# Altium footprint library Nanjar's Library.PcbLib: 153 footprints (part 4 of 10)
Each footprint in its own frame and in the unit in brackets; x right, y up, seen from the top. Pads: shape width x height; smd on the part's side, far side on the other; paste and mask are expansions set on the pad; w line width, h text height; cw(c..) or ccw(c..) is an arc to the next point about the centre after c.
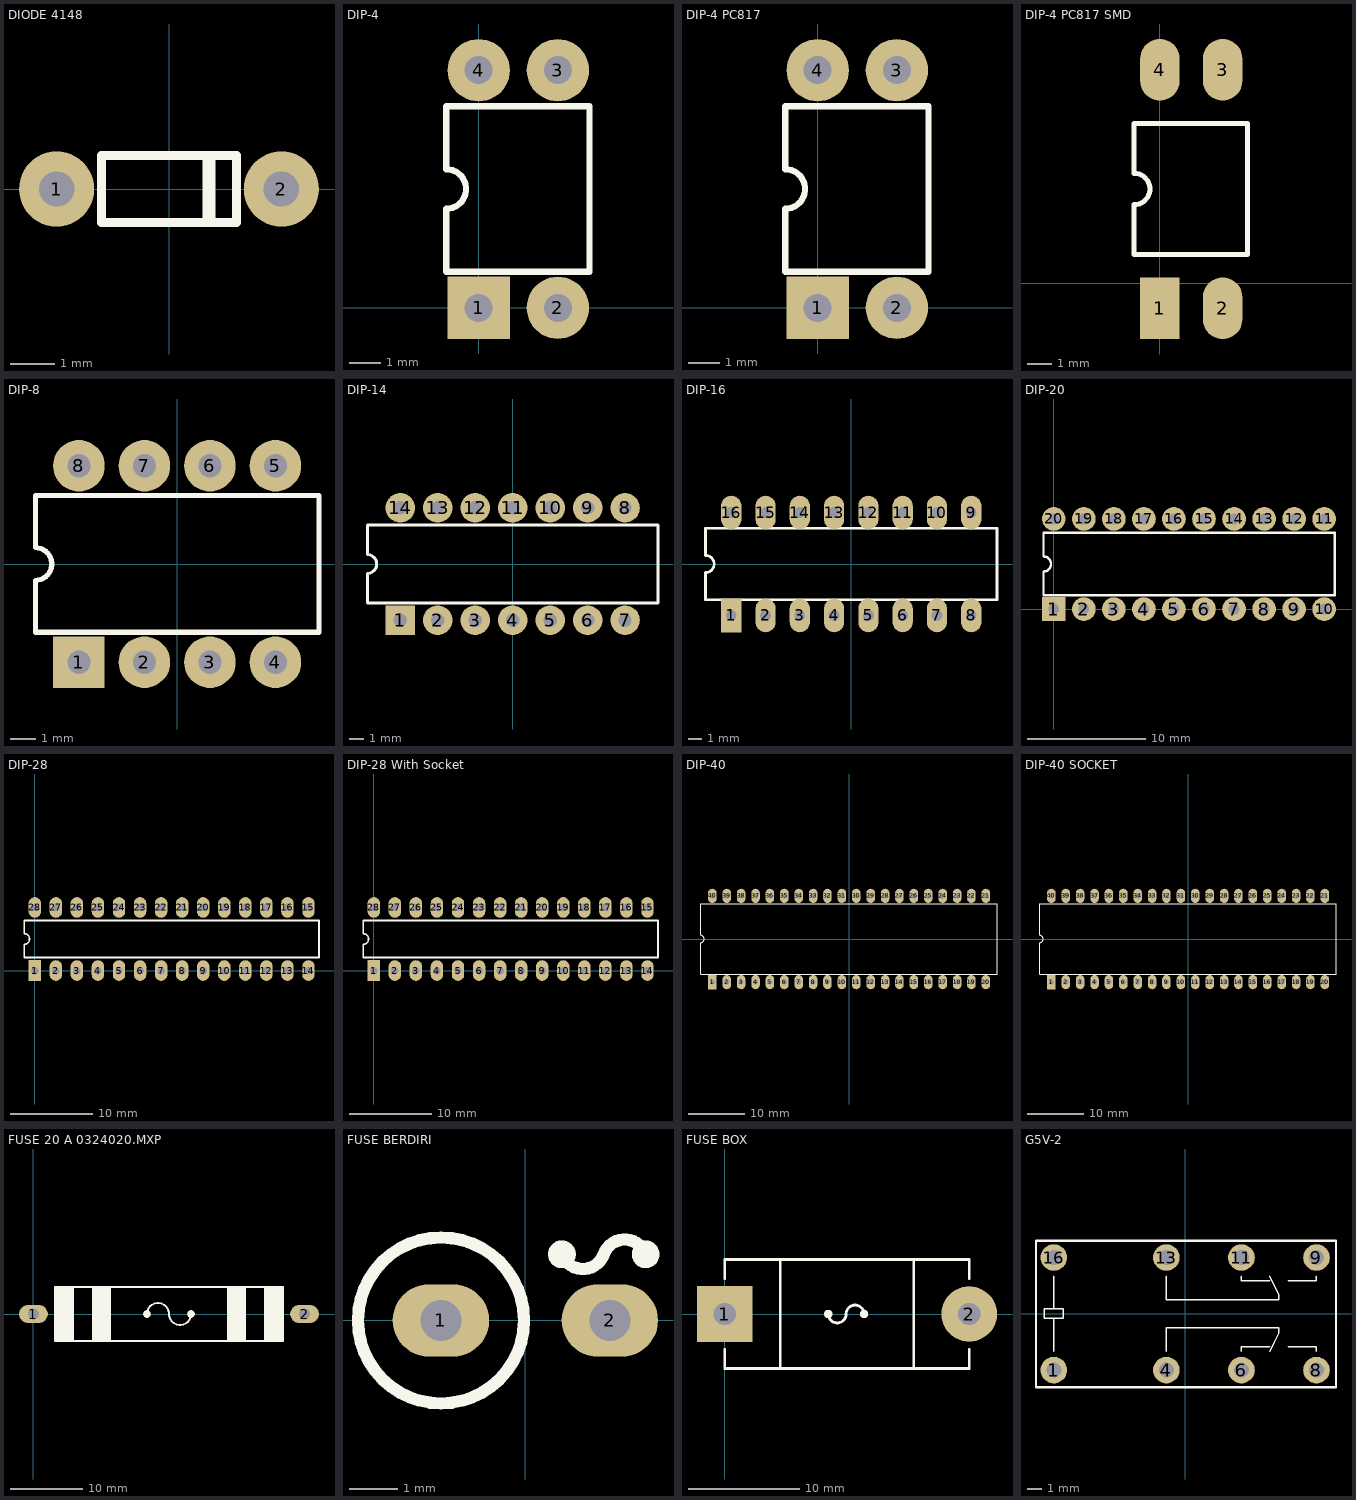
[diagram p3: the footprints below, top view; thin cyan lines are the x and y axes]

## DIODE 4148 [mm] "DIODE 4148"
height 1.9
pads (2):
  round 1.7 hole 0.8: 1(-2.54,0) 2(2.54,0)
Top Overlay:
  rectangle: 0.762,-0.762 1.054,0.762
  lines w0.2: -1.524,-0.762 -1.524,0.762 ; 1.524,-0.762 1.524,0.762
  lines w0.203: -1.524,-0.762 1.524,-0.762 ; -1.524,0.762 1.524,0.762
3D body "User Library-1N4148 x5mm.step": height 1.55, standoff -2.55, extent -2.75,-0.762 2.75,0.738

## DIP-4 [mm] "DIP; 14 Leads; Row Spacing 7.62 mm; Pitch 2.54 mm"
height 5.08
pads (4):
  rect 2x2 hole 0.9: 1(0,0)
  round 2 hole 0.9: 2(2.54,0) 3(2.54,7.62) 4(0,7.62)
Top Overlay:
  lines w0.2: -1.041,1.16 -1.041,3.175 ccw(c-1.041,3.81) -1.041,4.445 -1.041,6.46 3.556,6.46 3.556,1.16 -1.041,1.16
3D body "User Library-DIP4.STEP": height 3.75, standoff -2.55, extent -1.027,-0.074 3.567,7.796

## DIP-4 PC817 [mm] "DIP; 14 Leads; Row Spacing 7.62 mm; Pitch 2.54 mm"
height 5.08
pads (4):
  rect 2x2 hole 0.9: 1(0,0)
  round 2 hole 0.9: 2(2.54,0) 3(2.54,7.62) 4(0,7.62)
Top Overlay:
  lines w0.2: -1.041,1.16 -1.041,3.175 ccw(c-1.041,3.81) -1.041,4.445 -1.041,6.46 3.556,6.46 3.556,1.16 -1.041,1.16
3D body "User Library-DIP4-7_62-2_54.STEP": height 3.8, standoff -3.2, extent -1.027,-0.079 3.563,7.801

## DIP-4 PC817 SMD [mm] "DIP; 14 Leads; Row Spacing 7.62 mm; Pitch 2.54 mm"
height 5.08
pads (4):
  rect 1.6x2.5 smd: 1(0,-1.016)
  oval 1.6x2.5 smd: 2(2.54,-1.016) 3(2.54,8.636) 4(0,8.636)
Top Overlay:
  lines w0.2: -1.041,1.16 -1.041,3.175 ccw(c-1.041,3.81) -1.041,4.445 -1.041,6.46 3.556,6.46 3.556,1.16 -1.041,1.16
3D body "User Library-DIP4_opto_iso.STEP": height 3.9, standoff 0, extent -1.147,-1.154 3.684,8.876

## DIP-8 [mm] "DIP; 8 Leads; Row Spacing 7.62 mm; Pitch 2.54 mm"
height 5.08
pads (8):
  rect 2x2 hole 0.9: 1(-3.81,-3.81)
  round 2 hole 0.9: 2(-1.27,-3.81) 3(1.27,-3.81) 4(3.81,-3.81) 5(3.81,3.81) 6(1.27,3.81) 7(-1.27,3.81) 8(-3.81,3.81)
Top Overlay:
  lines w0.2: -5.5,-2.65 -5.5,-0.635 ccw(c-5.5,0) -5.5,0.635 -5.5,2.65 5.5,2.65 5.5,-2.65 -5.5,-2.65
3D body "SW3DPS-DIP8-DEFAULT.STEP": height 4.19, standoff -2.67, extent -5.725,-3.962 5.705,3.912

## DIP-14 [mm] "DIP; 14 Leads; Row Spacing 7.62 mm; Pitch 2.54 mm"
height 5.08
pads (14):
  rect 2x2 hole 0.9: 1(-7.62,-3.81)
  round 2 hole 0.9: 2(-5.08,-3.81) 3(-2.54,-3.81) 4(0,-3.81) 5(2.54,-3.81) 6(5.08,-3.81) 7(7.62,-3.81) 8(7.62,3.81) 9(5.08,3.81) 10(2.54,3.81) 11(0,3.81) 12(-2.54,3.81) 13(-5.08,3.81) 14(-7.62,3.81)
Top Overlay:
  lines w0.2: -9.85,-2.65 -9.85,-0.635 ccw(c-9.85,0) -9.85,0.635 -9.85,2.65 9.85,2.65 9.85,-2.65 -9.85,-2.65
3D body "SW3DPS-DIP-14-DEFAULT.STEP": height 3.51, standoff -3.47, extent -9.525,-3.95 9.525,4.05

## DIP-16 [mm] "DIP; 16 Leads; Row Spacing 7.62 mm; Pitch 2.54 mm"
height 5.08
pads (16):
  rect 1.5x2.5 hole 0.8: 1(-8.89,-3.81)
  oval 1.5x2.5 hole 0.8: 2(-6.35,-3.81) 3(-3.81,-3.81) 4(-1.27,-3.81) 5(1.27,-3.81) 6(3.81,-3.81) 7(6.35,-3.81) 8(8.89,-3.81) 9(8.89,3.81) 10(6.35,3.81) 11(3.81,3.81) 12(1.27,3.81) 13(-1.27,3.81) 14(-3.81,3.81) 15(-6.35,3.81) 16(-8.89,3.81)
Top Overlay:
  lines w0.2: -10.795,-2.65 -10.795,-0.635 ccw(c-10.795,0) -10.795,0.635 -10.795,2.65 10.8,2.65 10.8,-2.65 -10.795,-2.65
3D body "CircuitWorks-DIP16.step": height 2.57, standoff -4.19, extent -10.795,-3.81 10.795,4.064

## DIP-20 [mm] "DIP; 14 Leads; Row Spacing 7.62 mm; Pitch 2.54 mm"
height 5.08
pads (20):
  rect 2x2 hole 0.9: 1(0,0)
  round 2 hole 0.9: 2(2.54,0) 3(5.08,0) 4(7.62,0) 5(10.16,0) 6(12.7,0) 7(15.24,0) 8(17.78,0) 9(20.32,0) 10(22.86,0) 11(22.86,7.62) 12(20.32,7.62) 13(17.78,7.62) 14(15.24,7.62) 15(12.7,7.62) 16(10.16,7.62) 17(7.62,7.62) 18(5.08,7.62) 19(2.54,7.62) 20(0,7.62)
Top Overlay:
  lines w0.2: -0.87,1.16 -0.87,3.175 ccw(c-0.87,3.81) -0.87,4.445 -0.87,6.46 23.745,6.46 23.745,1.16 -0.87,1.16
3D body "User Library-DIP-20P-M01.STEP": height 4.36, standoff -3, extent -0.87,-0.125 23.73,7.745

## DIP-28 [mm] "DIP; 28 Leads; Row Spacing 7.62 mm; Pitch 2.54 mm"
height 4.58
pads (28):
  rect 1.5x2.5 hole 0.9: 1(0,0)
  oval 1.5x2.5 hole 0.9: 2(2.54,0) 3(5.08,0) 4(7.62,0) 5(10.16,0) 6(12.7,0) 7(15.24,0) 8(17.78,0) 9(20.32,0) 10(22.86,0) 11(25.4,0) 12(27.94,0) 13(30.48,0) 14(33.02,0) 15(33.02,7.62) 16(30.48,7.62) 17(27.94,7.62) 18(25.4,7.62) 19(22.86,7.62) 20(20.32,7.62) 21(17.78,7.62) 22(15.24,7.62) 23(12.7,7.62) 24(10.16,7.62) 25(7.62,7.62) 26(5.08,7.62) 27(2.54,7.62) 28(0,7.62)
Top Overlay:
  lines w0.2: -1.27,1.585 34.29,1.585 34.29,6.035 -1.27,6.035 -1.27,4.445 cw(c-1.27,3.81) -1.27,3.175 -1.27,1.585
3D body "User Library-DIP-28P-M04.STEP": height 4.8, standoff -3.4, extent -1.19,-0.125 34.21,7.745

## DIP-28 With Socket [mm] "DIP; 28 Leads; Row Spacing 7.62 mm; Pitch 2.54 mm"
height 4.58
pads (28):
  rect 1.5x2.5 hole 0.9: 1(0,0)
  oval 1.5x2.5 hole 0.9: 2(2.54,0) 3(5.08,0) 4(7.62,0) 5(10.16,0) 6(12.7,0) 7(15.24,0) 8(17.78,0) 9(20.32,0) 10(22.86,0) 11(25.4,0) 12(27.94,0) 13(30.48,0) 14(33.02,0) 15(33.02,7.62) 16(30.48,7.62) 17(27.94,7.62) 18(25.4,7.62) 19(22.86,7.62) 20(20.32,7.62) 21(17.78,7.62) 22(15.24,7.62) 23(12.7,7.62) 24(10.16,7.62) 25(7.62,7.62) 26(5.08,7.62) 27(2.54,7.62) 28(0,7.62)
Top Overlay:
  lines w0.2: -1.27,1.585 34.29,1.585 34.29,6.035 -1.27,6.035 -1.27,4.445 cw(c-1.27,3.81) -1.27,3.175 -1.27,1.585
3D body "User Library-28pin 0_3inch 2_54mm IC DIP Socket.STEP": height 5, standoff -3, extent -1.265,-1.265 34.295,8.895
3D body "User Library-DIP-28P-M04.STEP": height 8.8, standoff 0.6, extent -1.19,-0.125 34.21,7.745

## DIP-40 [mm] "DIP; 40 Leads; Row Spacing 15.24 mm; Pitch 2.54 mm"
height 5.72
pads (40):
  rect 1.5x2.5 hole 0.9: 1(-24.13,-7.62)
  oval 1.5x2.5 hole 0.9: 2(-21.59,-7.62) 3(-19.05,-7.62) 4(-16.51,-7.62) 5(-13.97,-7.62) 6(-11.43,-7.62) 7(-8.89,-7.62) 8(-6.35,-7.62) 9(-3.81,-7.62) 10(-1.27,-7.62) 11(1.27,-7.62) 12(3.81,-7.62) 13(6.35,-7.62) 14(8.89,-7.62) 15(11.43,-7.62) 16(13.97,-7.62) 17(16.51,-7.62) 18(19.05,-7.62) 19(21.59,-7.62) 20(24.13,-7.62) 21(24.13,7.62) 22(21.59,7.62) 23(19.05,7.62) 24(16.51,7.62) 25(13.97,7.62) 26(11.43,7.62) 27(8.89,7.62) 28(6.35,7.62) 29(3.81,7.62) 30(1.27,7.62) 31(-1.27,7.62) 32(-3.81,7.62) 33(-6.35,7.62) 34(-8.89,7.62) 35(-11.43,7.62) 36(-13.97,7.62) 37(-16.51,7.62) 38(-19.05,7.62) 39(-21.59,7.62) 40(-24.13,7.62)
Top Overlay:
  lines w0.2: -26.2,-6.2 26.1,-6.2 26.1,6.2 -26.2,6.2 -26.2,0.635 cw(c-26.2,0) -26.2,-0.635 -26.2,-6.2
3D body: height 1.31, standoff -2.5, extent -24.41,7.37 -23.85,7.87
3D body: height 2.8, standoff 0.81, extent -24.96,7.37 -23.29,7.87
3D body: height 3.08, standoff 2.58, extent -24.96,6.73 -23.29,7.62
3D body: height 3.07, standoff 2.58, extent -24.96,7.37 -23.29,7.868
3D body: height 3.07, standoff 2.58, extent -22.42,7.37 -20.75,7.868
3D body: height 3.08, standoff 2.58, extent -22.42,6.73 -20.75,7.62
3D body: height 2.8, standoff 0.81, extent -22.42,7.37 -20.75,7.87
3D body: height 1.31, standoff -2.5, extent -21.87,7.37 -21.31,7.87
3D body: height 3.07, standoff 2.58, extent -19.88,7.37 -18.21,7.868
3D body: height 3.08, standoff 2.58, extent -19.88,6.73 -18.21,7.62
3D body: height 2.8, standoff 0.81, extent -19.88,7.37 -18.21,7.87
3D body: height 1.31, standoff -2.5, extent -19.33,7.37 -18.77,7.87
3D body: height 3.07, standoff 2.58, extent -17.34,7.37 -15.67,7.868
3D body: height 3.08, standoff 2.58, extent -17.34,6.73 -15.67,7.62
3D body: height 2.8, standoff 0.81, extent -17.34,7.37 -15.67,7.87
3D body: height 1.31, standoff -2.5, extent -16.79,7.37 -16.23,7.87
3D body: height 1.31, standoff -2.5, extent -6.63,7.37 -6.07,7.87
3D body: height 2.8, standoff 0.81, extent -7.18,7.37 -5.51,7.87
3D body: height 3.08, standoff 2.58, extent -7.18,6.73 -5.51,7.62
3D body: height 3.07, standoff 2.58, extent -7.18,7.37 -5.51,7.868
3D body: height 1.31, standoff -2.5, extent -9.17,7.37 -8.61,7.87
3D body: height 2.8, standoff 0.81, extent -9.72,7.37 -8.05,7.87
3D body: height 3.08, standoff 2.58, extent -9.72,6.73 -8.05,7.62
3D body: height 3.07, standoff 2.58, extent -9.72,7.37 -8.05,7.868
3D body: height 1.31, standoff -2.5, extent -11.71,7.37 -11.15,7.87
3D body: height 2.8, standoff 0.81, extent -12.26,7.37 -10.59,7.87
3D body: height 3.08, standoff 2.58, extent -12.26,6.73 -10.59,7.62
3D body: height 3.07, standoff 2.58, extent -12.26,7.37 -10.59,7.868
3D body: height 3.07, standoff 2.58, extent -14.8,7.37 -13.13,7.868
3D body: height 3.08, standoff 2.58, extent -14.8,6.73 -13.13,7.62
3D body: height 2.8, standoff 0.81, extent -14.8,7.37 -13.13,7.87
3D body: height 1.31, standoff -2.5, extent -14.25,7.37 -13.69,7.87
3D body: height 1.31, standoff -2.5, extent 3.53,7.37 4.09,7.87
3D body: height 2.8, standoff 0.81, extent 2.98,7.37 4.65,7.87
3D body: height 3.08, standoff 2.58, extent 2.98,6.73 4.65,7.62
3D body: height 3.07, standoff 2.58, extent 2.98,7.37 4.65,7.868
3D body: height 1.31, standoff -2.5, extent 0.99,7.37 1.55,7.87
3D body: height 2.8, standoff 0.81, extent 0.44,7.37 2.11,7.87
3D body: height 3.08, standoff 2.58, extent 0.44,6.73 2.11,7.62
3D body: height 3.07, standoff 2.58, extent 0.44,7.37 2.11,7.868
3D body: height 1.31, standoff -2.5, extent -1.55,7.37 -0.99,7.87
3D body: height 2.8, standoff 0.81, extent -2.1,7.37 -0.43,7.87
3D body: height 3.08, standoff 2.58, extent -2.1,6.73 -0.43,7.62
3D body: height 3.07, standoff 2.58, extent -2.1,7.37 -0.43,7.868
3D body: height 3.07, standoff 2.58, extent -4.64,7.37 -2.97,7.868
3D body: height 3.08, standoff 2.58, extent -4.64,6.73 -2.97,7.62
3D body: height 2.8, standoff 0.81, extent -4.64,7.37 -2.97,7.87
3D body: height 1.31, standoff -2.5, extent -4.09,7.37 -3.53,7.87
3D body: height 1.31, standoff -2.5, extent 13.69,7.37 14.25,7.87
3D body: height 2.8, standoff 0.81, extent 13.14,7.37 14.81,7.87
3D body: height 3.08, standoff 2.58, extent 13.14,6.73 14.81,7.62
3D body: height 3.07, standoff 2.58, extent 13.14,7.37 14.81,7.868
3D body: height 1.31, standoff -2.5, extent 11.15,7.37 11.71,7.87
3D body: height 2.8, standoff 0.81, extent 10.6,7.37 12.27,7.87
3D body: height 3.08, standoff 2.58, extent 10.6,6.73 12.27,7.62
3D body: height 3.07, standoff 2.58, extent 10.6,7.37 12.27,7.868
3D body: height 1.31, standoff -2.5, extent 8.61,7.37 9.17,7.87
3D body: height 2.8, standoff 0.81, extent 8.06,7.37 9.73,7.87
3D body: height 3.08, standoff 2.58, extent 8.06,6.73 9.73,7.62
3D body: height 3.07, standoff 2.58, extent 8.06,7.37 9.73,7.868
3D body: height 3.07, standoff 2.58, extent 5.52,7.37 7.19,7.868
3D body: height 3.08, standoff 2.58, extent 5.52,6.73 7.19,7.62
3D body: height 2.8, standoff 0.81, extent 5.52,7.37 7.19,7.87
3D body: height 1.31, standoff -2.5, extent 6.07,7.37 6.63,7.87
3D body: height 1.31, standoff -2.5, extent 23.85,7.37 24.41,7.87
3D body: height 2.8, standoff 0.81, extent 23.3,7.37 24.97,7.87
3D body: height 3.08, standoff 2.58, extent 23.3,6.73 24.97,7.62
3D body: height 3.07, standoff 2.58, extent 23.3,7.37 24.97,7.868
3D body: height 1.31, standoff -2.5, extent 21.31,7.37 21.87,7.87
3D body: height 2.8, standoff 0.81, extent 20.76,7.37 22.43,7.87
3D body: height 3.08, standoff 2.58, extent 20.76,6.73 22.43,7.62
3D body: height 3.07, standoff 2.58, extent 20.76,7.37 22.43,7.868
3D body: height 1.31, standoff -2.5, extent 18.77,7.37 19.33,7.87
3D body: height 2.8, standoff 0.81, extent 18.22,7.37 19.89,7.87
3D body: height 3.08, standoff 2.58, extent 18.22,6.73 19.89,7.62
3D body: height 3.07, standoff 2.58, extent 18.22,7.37 19.89,7.868
3D body: height 3.07, standoff 2.58, extent 15.68,7.37 17.35,7.868
3D body: height 3.08, standoff 2.58, extent 15.68,6.73 17.35,7.62
3D body: height 2.8, standoff 0.81, extent 15.68,7.37 17.35,7.87
3D body: height 1.31, standoff -2.5, extent 16.23,7.37 16.79,7.87
3D body: height 1.31, standoff -2.5, extent -16.79,-7.87 -16.23,-7.37
3D body: height 2.8, standoff 0.81, extent -17.35,-7.87 -15.68,-7.37
3D body: height 3.08, standoff 2.58, extent -17.35,-7.62 -15.68,-6.73
3D body: height 3.07, standoff 2.58, extent -17.35,-7.868 -15.68,-7.37
3D body: height 3.07, standoff 2.58, extent -19.89,-7.868 -18.22,-7.37
3D body: height 3.08, standoff 2.58, extent -19.89,-7.62 -18.22,-6.73
3D body: height 2.8, standoff 0.81, extent -19.89,-7.87 -18.22,-7.37
3D body: height 1.31, standoff -2.5, extent -19.33,-7.87 -18.77,-7.37
3D body: height 3.07, standoff 2.58, extent -22.43,-7.868 -20.76,-7.37
3D body: height 3.08, standoff 2.58, extent -22.43,-7.62 -20.76,-6.73
3D body: height 2.8, standoff 0.81, extent -22.43,-7.87 -20.76,-7.37
3D body: height 1.31, standoff -2.5, extent -21.87,-7.87 -21.31,-7.37
3D body: height 3.07, standoff 2.58, extent -24.97,-7.868 -23.3,-7.37
3D body: height 3.08, standoff 2.58, extent -24.97,-7.62 -23.3,-6.73
3D body: height 2.8, standoff 0.81, extent -24.97,-7.87 -23.3,-7.37
3D body: height 1.31, standoff -2.5, extent -24.41,-7.87 -23.85,-7.37
3D body: height 1.31, standoff -2.5, extent -6.63,-7.87 -6.07,-7.37
3D body: height 2.8, standoff 0.81, extent -7.19,-7.87 -5.52,-7.37
3D body: height 3.08, standoff 2.58, extent -7.19,-7.62 -5.52,-6.73
3D body: height 3.07, standoff 2.58, extent -7.19,-7.868 -5.52,-7.37
3D body: height 3.07, standoff 2.58, extent -9.73,-7.868 -8.06,-7.37
3D body: height 3.08, standoff 2.58, extent -9.73,-7.62 -8.06,-6.73
3D body: height 2.8, standoff 0.81, extent -9.73,-7.87 -8.06,-7.37
3D body: height 1.31, standoff -2.5, extent -9.17,-7.87 -8.61,-7.37
3D body: height 3.07, standoff 2.58, extent -12.27,-7.868 -10.6,-7.37
3D body: height 3.08, standoff 2.58, extent -12.27,-7.62 -10.6,-6.73
3D body: height 2.8, standoff 0.81, extent -12.27,-7.87 -10.6,-7.37
3D body: height 1.31, standoff -2.5, extent -11.71,-7.87 -11.15,-7.37
3D body: height 3.07, standoff 2.58, extent -14.81,-7.868 -13.14,-7.37
3D body: height 3.08, standoff 2.58, extent -14.81,-7.62 -13.14,-6.73
3D body: height 2.8, standoff 0.81, extent -14.81,-7.87 -13.14,-7.37
3D body: height 1.31, standoff -2.5, extent -14.25,-7.87 -13.69,-7.37
3D body: height 1.31, standoff -2.5, extent 3.53,-7.87 4.09,-7.37
3D body: height 2.8, standoff 0.81, extent 2.97,-7.87 4.64,-7.37
3D body: height 3.08, standoff 2.58, extent 2.97,-7.62 4.64,-6.73
3D body: height 3.07, standoff 2.58, extent 2.97,-7.868 4.64,-7.37
3D body: height 3.07, standoff 2.58, extent 0.43,-7.868 2.1,-7.37
3D body: height 3.08, standoff 2.58, extent 0.43,-7.62 2.1,-6.73
3D body: height 2.8, standoff 0.81, extent 0.43,-7.87 2.1,-7.37
3D body: height 1.31, standoff -2.5, extent 0.99,-7.87 1.55,-7.37
3D body: height 3.07, standoff 2.58, extent -2.11,-7.868 -0.44,-7.37
3D body: height 3.08, standoff 2.58, extent -2.11,-7.62 -0.44,-6.73
3D body: height 2.8, standoff 0.81, extent -2.11,-7.87 -0.44,-7.37
3D body: height 1.31, standoff -2.5, extent -1.55,-7.87 -0.99,-7.37
3D body: height 3.07, standoff 2.58, extent -4.65,-7.868 -2.98,-7.37
3D body: height 3.08, standoff 2.58, extent -4.65,-7.62 -2.98,-6.73
3D body: height 2.8, standoff 0.81, extent -4.65,-7.87 -2.98,-7.37
3D body: height 1.31, standoff -2.5, extent -4.09,-7.87 -3.53,-7.37
3D body: height 1.31, standoff -2.5, extent 13.69,-7.87 14.25,-7.37
3D body: height 2.8, standoff 0.81, extent 13.13,-7.87 14.8,-7.37
3D body: height 3.08, standoff 2.58, extent 13.13,-7.62 14.8,-6.73
3D body: height 3.07, standoff 2.58, extent 13.13,-7.868 14.8,-7.37
3D body: height 3.07, standoff 2.58, extent 10.59,-7.868 12.26,-7.37
3D body: height 3.08, standoff 2.58, extent 10.59,-7.62 12.26,-6.73
3D body: height 2.8, standoff 0.81, extent 10.59,-7.87 12.26,-7.37
3D body: height 1.31, standoff -2.5, extent 11.15,-7.87 11.71,-7.37
3D body: height 3.07, standoff 2.58, extent 8.05,-7.868 9.72,-7.37
3D body: height 3.08, standoff 2.58, extent 8.05,-7.62 9.72,-6.73
3D body: height 2.8, standoff 0.81, extent 8.05,-7.87 9.72,-7.37
3D body: height 1.31, standoff -2.5, extent 8.61,-7.87 9.17,-7.37
3D body: height 3.07, standoff 2.58, extent 5.51,-7.868 7.18,-7.37
3D body: height 3.08, standoff 2.58, extent 5.51,-7.62 7.18,-6.73
3D body: height 2.8, standoff 0.81, extent 5.51,-7.87 7.18,-7.37
3D body: height 1.31, standoff -2.5, extent 6.07,-7.87 6.63,-7.37
3D body: height 1.31, standoff -2.5, extent 16.23,-7.87 16.79,-7.37
3D body: height 2.8, standoff 0.81, extent 15.67,-7.87 17.34,-7.37
3D body: height 3.08, standoff 2.58, extent 15.67,-7.62 17.34,-6.73
3D body: height 3.07, standoff 2.58, extent 15.67,-7.868 17.34,-7.37
3D body: height 1.31, standoff -2.5, extent 18.77,-7.87 19.33,-7.37
3D body: height 2.8, standoff 0.81, extent 18.21,-7.87 19.88,-7.37
3D body: height 3.08, standoff 2.58, extent 18.21,-7.62 19.88,-6.73
3D body: height 3.07, standoff 2.58, extent 18.21,-7.868 19.88,-7.37
3D body: height 1.31, standoff -2.5, extent 21.31,-7.87 21.87,-7.37
3D body: height 2.8, standoff 0.81, extent 20.75,-7.87 22.42,-7.37
3D body: height 3.08, standoff 2.58, extent 20.75,-7.62 22.42,-6.73
3D body: height 3.07, standoff 2.58, extent 20.75,-7.868 22.42,-7.37
3D body: height 3.07, standoff 2.58, extent 23.29,-7.868 24.96,-7.37
3D body: height 3.08, standoff 2.58, extent 23.29,-7.62 24.96,-6.73
3D body: height 2.8, standoff 0.81, extent 23.29,-7.87 24.96,-7.37
3D body: height 1.31, standoff -2.5, extent 23.85,-7.87 24.41,-7.37
3D body: height 4.83, standoff 4.8, extent -2.653,-0.7 -1.599,0.807
3D body: height 4.83, standoff 4.8, extent -1.842,-0.7 2.501,1.301
3D body: height 4.83, standoff 4.8, extent -0.901,-0.7 0.401,0.801
3D body: height 4.83, standoff 4.8, extent 0.601,-0.699 1.399,0.8
3D body: height 4.83, standoff 4.8, extent 1.599,-0.7 2.601,0.801
3D body: height 4.83, standoff 4.8, extent -2.699,-1.2 2.105,-0.9
3D body: height 4.83, standoff 0.38, extent -26.199,-6.899 26.099,6.799
3D body: height 4.9, standoff 4.8, extent -24.88,-5.52 -23.485,-4.123

## DIP-40 SOCKET [mm] "DIP; 40 Leads; Row Spacing 15.24 mm; Pitch 2.54 mm"
height 5.72
pads (40):
  rect 1.5x2.5 hole 0.9: 1(-24.13,-7.62)
  oval 1.5x2.5 hole 0.9: 2(-21.59,-7.62) 3(-19.05,-7.62) 4(-16.51,-7.62) 5(-13.97,-7.62) 6(-11.43,-7.62) 7(-8.89,-7.62) 8(-6.35,-7.62) 9(-3.81,-7.62) 10(-1.27,-7.62) 11(1.27,-7.62) 12(3.81,-7.62) 13(6.35,-7.62) 14(8.89,-7.62) 15(11.43,-7.62) 16(13.97,-7.62) 17(16.51,-7.62) 18(19.05,-7.62) 19(21.59,-7.62) 20(24.13,-7.62) 21(24.13,7.62) 22(21.59,7.62) 23(19.05,7.62) 24(16.51,7.62) 25(13.97,7.62) 26(11.43,7.62) 27(8.89,7.62) 28(6.35,7.62) 29(3.81,7.62) 30(1.27,7.62) 31(-1.27,7.62) 32(-3.81,7.62) 33(-6.35,7.62) 34(-8.89,7.62) 35(-11.43,7.62) 36(-13.97,7.62) 37(-16.51,7.62) 38(-19.05,7.62) 39(-21.59,7.62) 40(-24.13,7.62)
Top Overlay:
  lines w0.2: -26.2,-6.2 -26.2,-0.635 ccw(c-26.2,0) -26.2,0.635 -26.2,6.2 26.1,6.2 26.1,-6.2 -26.2,-6.2
3D body "User Library-DIP40-600-with-chip-Type2.step": height 7.98, standoff -3.18, extent -26.13,-8.8 26.13,8.8

## FUSE 20 A 0324020.MXP [mm]
pads (2):
  oval 4x2.5 hole 1.5: 1(0,0) 2(37.5,0)
Top Overlay:
  circle w0.254: c21.798,0.051 r0.198
  circle w0.254: c21.798,0 r0.402
  circle w0.254: c15.702,0 r0.402
  circle w0.254: c15.707,0 r0.198
  rectangle: 26.772,-3.75 29.413,3.75
  rectangle: 31.858,-3.75 34.5,3.75
  region: 5.642,3.75 3,3.75 3,-3.75 5.642,-3.75
  region: 10.728,3.75 8.087,3.75 8.087,-3.75 10.728,-3.75
  lines w0.254: 15.702,0 cw(c17.226,0) 18.75,0 ccw(c20.274,0) 21.798,0 ; 3,-3.75 3,3.75 34.5,3.75 34.5,-3.75 3,-3.75

## FUSE BERDIRI [mm]
height 2
pads (2):
  oval 2x1.5 hole 0.85: 1(-1.75,0) 2(1.75,0)
Top Overlay:
  circle w0.254: c0.758,1.372 r0.161
  circle w0.254: c2.494,1.372 r0.161
  circle w0.254: c-1.749,0 r1.721
  lines w0.254: 0.758,1.372 ccw(c1.192,1.527) 1.626,1.372 cw(c2.06,1.216) 2.494,1.372
3D body: height 7, standoff 1, extent -1.851,-0.1 -1.651,0.1
3D body: height 7, standoff 1, extent -3.011,-1.267 -0.481,1.267
3D body: height 8, standoff 7, extent -2.056,-0.304 -1.449,0.304
3D body: height 8.3, standoff 7.7, extent -2.056,-0.304 -1.45,0.303
3D body: height 7.98, standoff -1, extent 1.447,-0.304 2.054,0.304
3D body: height 1.8, standoff 0.5, extent -3.011,-1.267 -0.481,1.268
3D body: height 7.36, standoff 6.16, extent -3.011,-1.267 -0.481,1.268
3D body: height 1.38, standoff -1, extent -2.053,-0.304 -1.446,0.304
3D body: height 8.3, standoff 7.7, extent -1.749,-0.304 1.751,0.304
3D body: height 8.3, standoff 7.7, extent 1.447,-0.304 2.053,0.303

## FUSE BOX [mm]
pads (2):
  rect 5x5 hole 2: 1(0,0)
  round 5 hole 2: 2(22,0)
Top Overlay:
  circle w0.254: c9.316,0 r0.254
  circle w0.254: c12.528,0 r0.254
  lines w0.254: 0,-3.175 0,-4.9 22,-4.9 22,-3.175 ; 0,3.175 0,4.9 22,4.9 22,3.175 ; 5,-4.9 5,4.9 ; 9.316,0 ccw(c10.119,0) 10.922,0 cw(c11.725,0) 12.528,0 ; 17,-4.9 17,4.9
3D body: height 5, standoff -2, extent -0.415,-0.635 0.22,0.635
3D body: height 5, standoff -2, extent 21.78,-0.635 22.415,0.635
3D body: height 10, standoff 0, extent -2.667,-4.9 24.638,4.9
3D body: height 7.98, standoff 2, extent -0.715,-2.94 4.285,3.048
3D body: height 7.98, standoff 2, extent 17.635,-2.94 22.635,3.048
3D body: height 7.97, standoff 2.01, extent 3.168,-2.921 18.168,3.047
3D body: height 5.5, standoff 5, extent 0.063,-0.635 21.78,0.635

## G5V-2 [mil] "G5V-2"
pads (8):
  round 71 hole 40: 1(-350,-150) 4(-50,-150) 6(150,-150) 8(350,-150) 9(350,150) 11(150,150) 13(-50,150) 16(-350,150)
Top Overlay:
  lines w4: -350,-100 -350,-12.5 ; -350,100 -350,13 ; -50,-100 -50,-37.5 250,-37.5 250,-50 225,-100 ; -50,100 -50,38 250,38 250,50 225,100 ; 150,-100 150,-87.5 225,-87.5 ; 150,100 150,88 225,88 ; 275,-87.5 350,-87.5 350,-100 ; 275,88 350,88 350,100 ; -350,-12.5 -375,-12.5 -375,13 -350,13 ; -350,-12.5 -325,-12.5 -325,13 -350,13
  lines w6: -397.6,-196.02 402,-196.02 402,195 -397.6,195 -397.6,-196.02